# Altium footprint library PcbLib_Pin_Headers_part2.PcbLib: 68 footprints (part 1 of 5)
Each footprint in its own frame and in the unit in brackets; x right, y up, seen from the top. Pads: shape width x height; smd on the part's side, far side on the other; paste and mask are expansions set on the pad; w line width, h text height; cw(c..) or ccw(c..) is an arc to the next point about the centre after c.
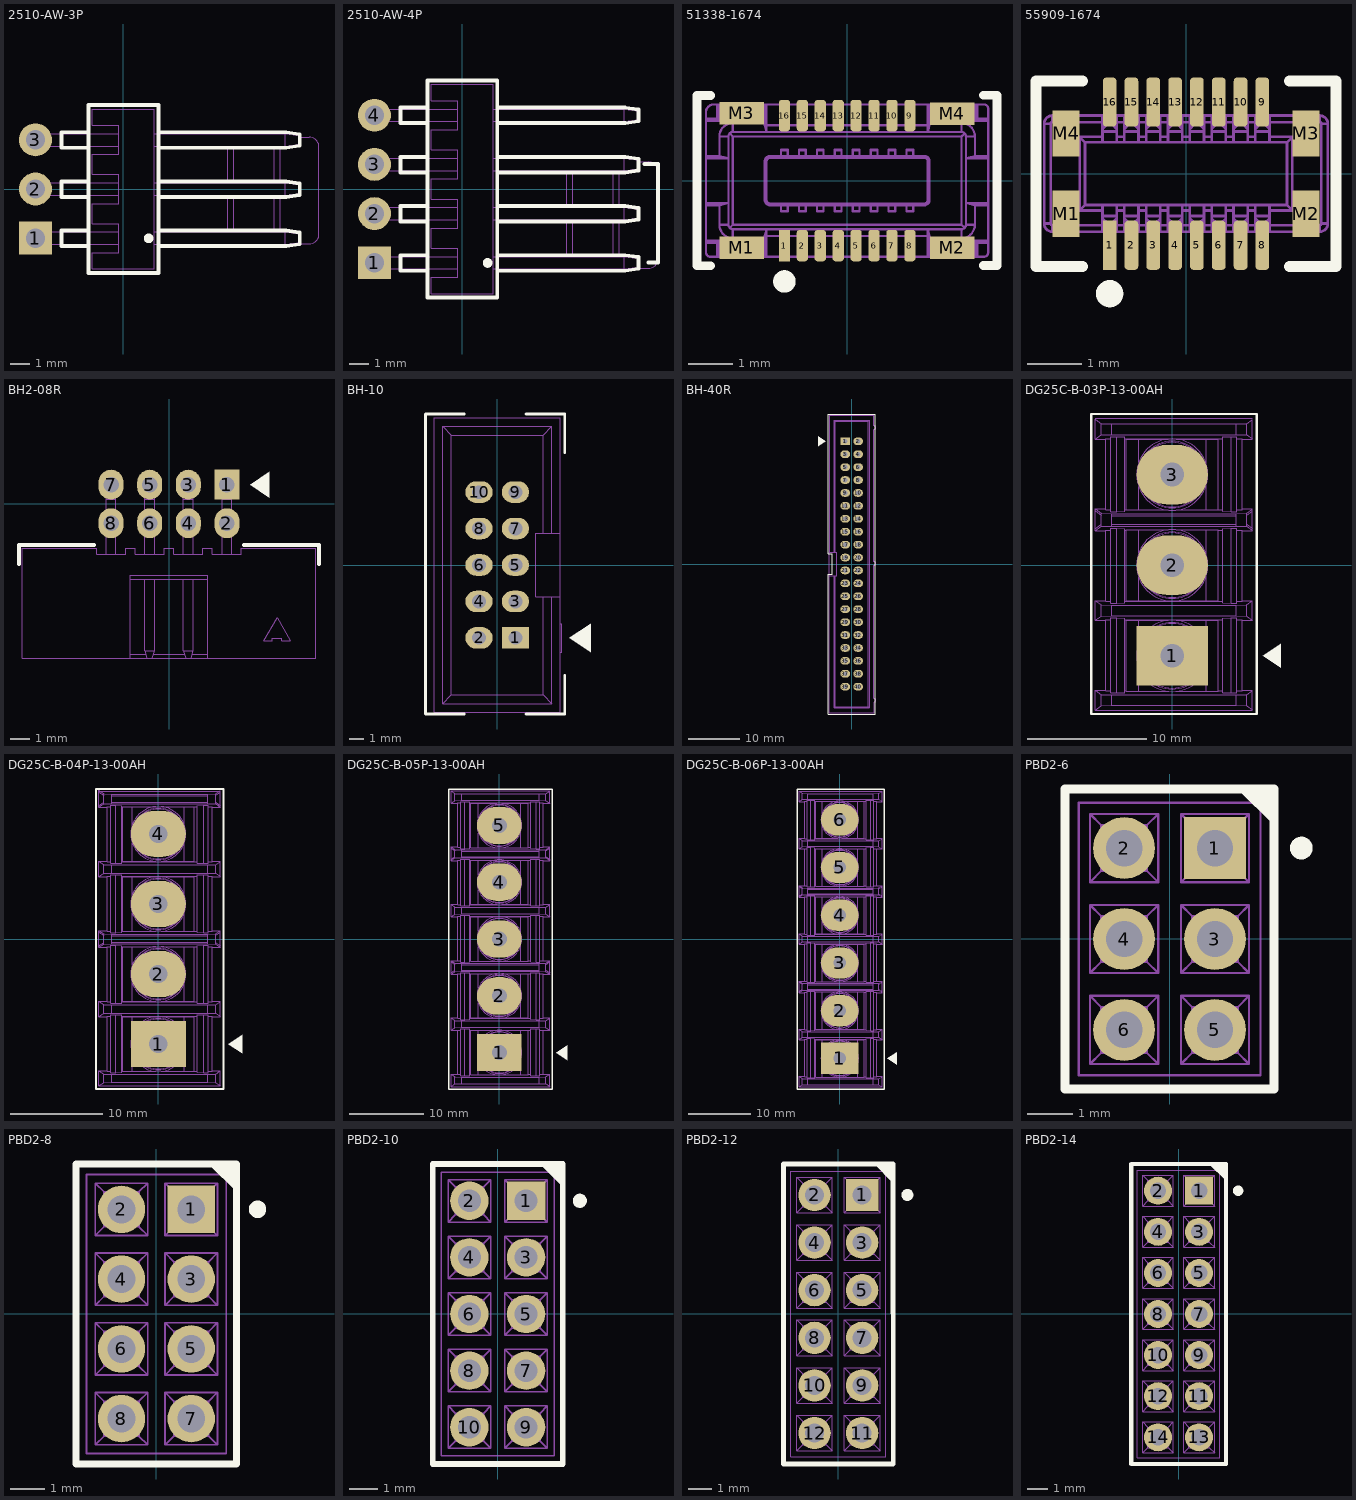
[diagram p0: the footprints below, top view; thin cyan lines are the x and y axes]

## 2510-AW-3P [mm]
pads (3):
  rect 1.7x1.7 hole 1: 1(-4.545,-2.54)
  round 1.7 hole 1: 2(-4.545,0) 3(-4.545,2.54)
Top Overlay:
  circle w0.25: c1.3,-2.55 r0.125
  lines w0.2: -1.8,-2.95 -3.2,-2.95 -3.2,-2.15 -1.8,-2.15 ; -1.8,-0.41 -3.2,-0.41 -3.2,0.39 -1.8,0.39 ; -1.8,2.13 -3.2,2.13 -3.2,2.93 -1.8,2.93 ; 1.8,-2.95 8.4,-2.95 9.1,-2.85 9.1,-2.25 8.4,-2.15 1.8,-2.15 ; 1.8,-0.41 8.4,-0.41 9.1,-0.31 9.1,0.29 8.4,0.39 1.8,0.39 ; 1.8,2.13 8.4,2.13 9.1,2.23 9.1,2.83 8.4,2.93 1.8,2.93 ; -1.8,-4.33 1.8,-4.33 1.8,4.33 -1.8,4.33 -1.8,-4.33
Top Assy:
  lines w0.05: -0.255,-2.86 -3.205,-2.86 ; -0.255,-2.22 -3.205,-2.22 ; -0.255,-0.32 -3.205,-0.32 ; -0.255,0.32 -3.205,0.32 ; -0.255,2.22 -3.205,2.22 ; -0.255,2.86 -3.205,2.86 ; 1.595,-2.86 8.345,-2.86 ; 1.595,-2.22 8.345,-2.22 ; 1.595,-0.32 8.345,-0.32 ; 1.595,0.32 8.345,0.32 ; 1.595,2.22 8.345,2.22 ; 1.595,2.86 8.345,2.86 ; 5.395,-2.22 5.395,-0.32 ; 5.395,0.32 5.395,2.22 ; 5.695,-2.22 5.695,-0.32 ; 5.695,0.32 5.695,2.22 ; 7.795,-2.22 7.795,-0.32 ; 7.795,0.32 7.795,2.22 ; 8.095,-2.22 8.095,-0.32 ; 8.095,0.32 8.095,2.22 ; 8.558,-2.83 9.595,-2.83 ccw(c9.595,-2.33) 10.095,-2.33 10.095,2.17 ccw(c9.595,2.17) 9.595,2.67 9.145,2.67 ; -3.205,-2.86 -3.205,-2.22 ; -3.205,-2.86 -4.845,-2.86 -4.845,-2.22 -3.205,-2.22 ; -3.205,-0.32 -3.205,0.32 ; -3.205,-0.32 -4.845,-0.32 -4.845,0.32 -3.205,0.32 ; -3.205,2.22 -3.205,2.86 ; -3.205,2.22 -4.845,2.22 -4.845,2.86 -3.205,2.86 ; 8.345,-2.86 8.345,-2.22 ; 8.345,-2.86 9.145,-2.748 9.145,-2.332 8.345,-2.22 ; 8.345,-0.32 8.345,0.32 ; 8.345,-0.32 9.145,-0.208 9.145,0.208 8.345,0.32 ; 8.345,2.22 8.345,2.86 ; 8.345,2.22 9.145,2.332 9.145,2.748 8.345,2.86 ; -1.605,-4.13 -1.605,-3.29 -0.255,-3.29 -0.255,-1.79 -1.605,-1.79 -1.605,-0.75 -0.255,-0.75 -0.255,0.75 -1.605,0.75 -1.605,1.79 -0.255,1.79 -0.255,3.29 -1.605,3.29 -1.605,4.13 1.595,4.13 1.595,-4.13 -1.605,-4.13
  text ".Designator" at 1.02,-3.098 h1.8
3D body "2510-AW-3p.x_t": height 5.75, standoff -3.35, extent -4.84,-4.13 10.1,4.13

## 2510-AW-4P [mm]
pads (4):
  rect 1.7x1.7 hole 1: 1(-4.545,-3.81)
  round 1.7 hole 1: 2(-4.545,-1.27) 3(-4.545,1.27) 4(-4.545,3.81)
Top Overlay:
  circle w0.25: c1.3,-3.82 r0.125
  lines w0.2: -1.8,-4.22 -3.2,-4.22 -3.2,-3.42 -1.8,-3.42 ; -1.8,-1.68 -3.2,-1.68 -3.2,-0.88 -1.8,-0.88 ; -1.8,0.86 -3.2,0.86 -3.2,1.66 -1.8,1.66 ; -1.8,3.4 -3.2,3.4 -3.2,4.2 -1.8,4.2 ; 1.8,-4.22 8.4,-4.22 9.1,-4.12 9.1,-3.52 8.4,-3.42 1.8,-3.42 ; 1.8,-1.68 8.4,-1.68 9.1,-1.58 9.1,-0.98 8.4,-0.88 1.8,-0.88 ; 1.8,0.86 8.4,0.86 9.1,0.96 9.1,1.56 8.4,1.66 1.8,1.66 ; 1.8,3.4 8.4,3.4 9.1,3.5 9.1,4.1 8.4,4.2 1.8,4.2 ; 9.4,1.3 10.1,1.3 10.1,-3.8 9.6,-3.8 ; -1.8,-5.6 -1.8,5.6 1.8,5.6 1.8,-5.6 -1.8,-5.6
Top Assy:
  lines w0.05: -0.255,-4.13 -3.205,-4.13 ; -0.255,-3.49 -3.205,-3.49 ; -0.255,-1.59 -3.205,-1.59 ; -0.255,-0.95 -3.205,-0.95 ; -0.255,0.95 -3.205,0.95 ; -0.255,1.59 -3.205,1.59 ; -0.255,3.49 -3.205,3.49 ; -0.255,4.13 -3.205,4.13 ; 1.595,-4.13 8.345,-4.13 ; 1.595,-3.49 8.345,-3.49 ; 1.595,-1.59 8.345,-1.59 ; 1.595,-0.95 8.345,-0.95 ; 1.595,0.95 8.345,0.95 ; 1.595,1.59 8.345,1.59 ; 1.595,3.49 8.345,3.49 ; 1.595,4.13 8.345,4.13 ; 5.395,-3.49 5.395,-1.59 ; 5.395,-0.95 5.395,0.95 ; 5.695,-3.49 5.695,-1.59 ; 5.695,-0.95 5.695,0.95 ; 7.795,-3.49 7.795,-1.59 ; 7.795,-0.95 7.795,0.95 ; 8.095,-3.49 8.095,-1.59 ; 8.095,-0.95 8.095,0.95 ; 8.558,-4.1 9.595,-4.1 ccw(c9.595,-3.6) 10.095,-3.6 10.095,0.9 ccw(c9.595,0.9) 9.595,1.4 9.145,1.4 ; -3.205,-4.13 -3.205,-3.49 ; -3.205,-4.13 -4.845,-4.13 -4.845,-3.49 -3.205,-3.49 ; -3.205,-1.59 -3.205,-0.95 ; -3.205,-1.59 -4.845,-1.59 -4.845,-0.95 -3.205,-0.95 ; -3.205,0.95 -3.205,1.59 ; -3.205,0.95 -4.845,0.95 -4.845,1.59 -3.205,1.59 ; -3.205,3.49 -3.205,4.13 ; -3.205,3.49 -4.845,3.49 -4.845,4.13 -3.205,4.13 ; 8.345,-4.13 8.345,-3.49 ; 8.345,-4.13 9.145,-4.018 9.145,-3.602 8.345,-3.49 ; 8.345,-1.59 8.345,-0.95 ; 8.345,-1.59 9.145,-1.478 9.145,-1.062 8.345,-0.95 ; 8.345,0.95 8.345,1.59 ; 8.345,0.95 9.145,1.062 9.145,1.478 8.345,1.59 ; 8.345,3.49 8.345,4.13 ; 8.345,3.49 9.145,3.602 9.145,4.018 8.345,4.13 ; -1.605,-5.4 1.595,-5.4 1.595,5.4 -1.605,5.4 -1.605,4.56 -0.255,4.56 -0.255,3.06 -1.605,3.06 -1.605,2.02 -0.255,2.02 -0.255,0.52 -1.605,0.52 -1.605,-0.52 -0.255,-0.52 -0.255,-2.02 -1.605,-2.02 -1.605,-3.06 -0.255,-3.06 -0.255,-4.56 -1.605,-4.56 -1.605,-5.4
  text ".Designator" at 1.02,-3.098 h1.8
3D body "2510-AW.x_t": height 5.75, standoff -3.35, extent -4.84,-5.4 10.1,5.4

## 51338-1674 [mm]
pads (20):
  rect 0.25x0.7 smd mask+0.05: 1(-1.4,-1.45)
  rrect50% 0.25x0.7 smd mask+0.05: 2(-1,-1.45) 3(-0.6,-1.45) 4(-0.2,-1.45) 5(0.2,-1.45) 6(0.6,-1.45) 7(1,-1.45) 8(1.4,-1.45) 9(1.4,1.45) 10(1,1.45) 11(0.6,1.45) 12(0.2,1.45) 13(-0.2,1.45) 14(-0.6,1.45) 15(-1,1.45) 16(-1.4,1.45)
  rect 1x0.5 smd mask+0.05: M1(-2.35,-1.5) M2(2.343,-1.496) M3(-2.35,1.5) M4(2.343,1.496)
Top Overlay:
  circle w0.25: c-1.4,-2.25 r0.125
  lines w0.2: -3.05,-1.9 -3.35,-1.9 -3.35,1.9 -3.05,1.9 ; 3.043,-1.896 3.343,-1.896 3.343,1.904 3.043,1.904
Top Assy:
  drawing of 359 lines, arcs and shapes, not listed
  text ".Designator" at -2.579,-0.349 h1.5
3D body "513381674.STEP": height 1.39, standoff -0.01, extent -3.15,-1.7 3.15,1.7

## 55909-1674 [mm]
pads (20):
  rect 0.25x0.9 smd mask+0.05: 1(-1.4,-1.312)
  rrect50% 0.25x0.9 smd mask+0.05: 2(-1,-1.312) 3(-0.6,-1.312) 4(-0.2,-1.312) 5(0.2,-1.312) 6(0.6,-1.312) 7(1,-1.312) 8(1.4,-1.312) 9(1.4,1.312) 10(1,1.312) 11(0.6,1.312) 12(0.2,1.312) 13(-0.2,1.312) 14(-0.6,1.312) 15(-1,1.312) 16(-1.4,1.312)
  rect 0.5x0.85 smd mask+0.05: M1(-2.2,-0.737) M2(2.2,-0.737) M3(2.2,0.737) M4(-2.2,0.737)
Top Overlay:
  circle w0.25: c-1.4,-2.2 r0.125
  lines w0.2: -1.9,-1.7 -2.75,-1.7 -2.75,1.7 -1.9,1.7 ; 1.9,-1.7 2.75,-1.7 2.75,1.7 1.9,1.7
Top Assy:
  drawing of 388 lines, arcs and shapes, not listed
  text ".Designator" at -2.064,-0.28 h1.2
3D body "559091674.STEP": height 1.19, standoff -0.01, extent -2.6,-1.565 2.6,1.565

## BH2-08R [mm]
pads (8):
  rect 1.3x1.55 hole 0.8: 1(3,1)
  oval 1.3x1.55 hole 0.8: 2(3,-1) 3(1,1) 4(1,-1) 5(-1,1) 6(-1,-1) 7(-3,1) 8(-3,-1)
Top Overlay:
  region: 4.2,1 5.2,1.667 5.2,0.333
  lines w0.2: -7.775,-3.125 -7.775,-2.125 -3.875,-2.125 ; 3.875,-2.125 7.775,-2.125 7.775,-3.125
Top Assy:
  lines w0.05: -3.25,-2.6 -3.25,0.25 ; -2.75,-2.6 -2.75,0.25 ; -2,-7.8 -1.196,-7.8 ; -2,-3.9 2,-3.9 ; -1.25,-3.9 -1.25,-7.6 ; -1.25,-2.6 -1.25,0.25 ; -0.804,-7.8 0.804,-7.8 ; -0.75,-3.9 -0.75,-7.6 ; -0.75,-2.6 -0.75,0.25 ; 0.75,-3.9 0.75,-7.6 ; 0.75,-2.6 0.75,0.25 ; 1.196,-7.8 2,-7.8 ; 1.25,-3.9 1.25,-7.6 ; 1.25,-2.6 1.25,0.25 ; 2.75,-2.6 2.75,0.25 ; 3.25,-2.6 3.25,0.25 ; -3.25,0.25 -2.75,0.25 ; -3.25,0.25 -3.25,1.25 -2.75,1.25 -2.75,0.25 ; -2,-8 -2,-3.7 2,-3.7 2,-8 ; -2,-8 -7.6,-8 -7.6,-2.3 -3.75,-2.3 -3.75,-2.6 -2.25,-2.6 -2.25,-2.3 -1.75,-2.3 -1.75,-2.6 -0.25,-2.6 -0.25,-2.3 0.25,-2.3 0.25,-2.6 1.75,-2.6 1.75,-2.3 2.25,-2.3 2.25,-2.6 3.75,-2.6 3.75,-2.3 7.6,-2.3 7.6,-8 2,-8 ; -2,-8 -1.143,-8 ; -1.25,-7.6 -0.75,-7.6 ; -1.25,-7.6 -1.143,-8 ; -1.25,0.25 -0.75,0.25 ; -1.25,0.25 -1.25,1.25 -0.75,1.25 -0.75,0.25 ; -1.143,-8 -0.857,-8 ; -0.857,-8 0.857,-8 ; -0.857,-8 -0.75,-7.6 ; 0.75,-7.6 1.25,-7.6 ; 0.75,-7.6 0.857,-8 ; 0.75,0.25 1.25,0.25 ; 0.75,0.25 0.75,1.25 1.25,1.25 1.25,0.25 ; 0.857,-8 1.143,-8 ; 1.143,-8 2,-8 ; 1.143,-8 1.25,-7.6 ; 2.75,0.25 3.25,0.25 ; 2.75,0.25 2.75,1.25 3.25,1.25 3.25,0.25 ; 4.907,-7.1 5.6,-5.9 6.293,-7.1 5.85,-7.1 5.85,-6.95 5.35,-6.95 5.35,-7.1 4.907,-7.1
  text ".Designator" at -7.943,-5.467 h2
3D body "BH2-08R.STEP": height 5.69, standoff -2.61, extent -7.6,-8 7.6,1.25

## BH-10 [mm] "DS1013-10S CONNFLY"
pads (10):
  rect 1.9x1.5 hole 0.95: 1(1.27,-5.08)
  oval 1.9x1.5 hole 0.95: 2(-1.27,-5.08) 3(1.27,-2.54) 4(-1.27,-2.54) 5(1.27,0) 6(-1.27,0) 7(1.27,2.54) 8(-1.27,2.54) 9(1.27,5.08) 10(-1.27,5.08)
Top Overlay:
  region: 5,-5.08 6.5,-4.08 6.5,-6.08
  lines w0.2: -2.3,-10.38 -5,-10.38 -5,-7.68 -5,0.92 -5,10.52 -2.3,10.52 ; 2,-10.38 4.7,-10.38 4.7,-7.68 ; 2,10.52 4.7,10.52 4.7,7.82
Top Assy:
  lines w0.05: 4.4,-6.08 4.5,-6.08 4.5,-4.08 4.4,-4.08 ; -3.8,-9.65 -3.8,9.65 ; -3.8,-9.65 3.8,-9.65 ; -3.8,-9.65 -3.2,-9.05 ; -3.8,9.65 3.8,9.65 ; -3.8,9.65 -3.2,9.05 ; -3.2,-9.05 -3.2,9.05 ; -3.2,-9.05 3.2,-9.05 ; -3.2,9.05 3.2,9.05 ; -1.59,-5.4 -1.49,-5.3 ; -1.59,-5.4 -1.59,-4.76 ; -1.59,-5.4 -0.95,-5.4 ; -1.59,-4.76 -1.49,-4.86 ; -1.59,-4.76 -0.95,-4.76 ; -1.59,-2.86 -1.49,-2.76 ; -1.59,-2.86 -1.59,-2.22 ; -1.59,-2.86 -0.95,-2.86 ; -1.59,-2.22 -1.49,-2.32 ; -1.59,-2.22 -0.95,-2.22 ; -1.59,-0.32 -0.95,-0.32 ; -1.59,-0.32 -1.49,-0.22 ; -1.59,-0.32 -1.59,0.32 ; -1.59,0.32 -1.49,0.22 ; -1.59,0.32 -0.95,0.32 ; -1.59,2.22 -0.95,2.22 ; -1.59,2.22 -1.49,2.32 ; -1.59,2.22 -1.59,2.86 ; -1.59,2.86 -1.49,2.76 ; -1.59,2.86 -0.95,2.86 ; -1.59,4.76 -1.49,4.86 ; -1.59,4.76 -1.59,5.4 ; -1.59,4.76 -0.95,4.76 ; -1.59,5.4 -1.49,5.3 ; -1.59,5.4 -0.95,5.4 ; -1.49,-5.3 -1.49,-4.86 ; -1.49,-5.3 -1.05,-5.3 ; -1.49,-4.86 -1.05,-4.86 ; -1.49,-2.76 -1.49,-2.32 ; -1.49,-2.76 -1.05,-2.76 ; -1.49,-2.32 -1.05,-2.32 ; -1.49,-0.22 -1.05,-0.22 ; -1.49,-0.22 -1.49,0.22 ; -1.49,0.22 -1.05,0.22 ; -1.49,2.32 -1.05,2.32 ; -1.49,2.32 -1.49,2.76 ; -1.49,2.76 -1.05,2.76 ; -1.49,4.86 -1.49,5.3 ; -1.49,4.86 -1.05,4.86 ; -1.49,5.3 -1.05,5.3 ; -1.05,-5.3 -1.05,-4.86 ; -1.05,-5.3 -0.95,-5.4 ; -1.05,-4.86 -0.95,-4.76 ; -1.05,-2.76 -1.05,-2.32 ; -1.05,-2.76 -0.95,-2.86 ; -1.05,-2.32 -0.95,-2.22 ; -1.05,-0.22 -0.95,-0.32 ; -1.05,-0.22 -1.05,0.22 ; -1.05,0.22 -0.95,0.32 ; -1.05,2.32 -0.95,2.22 ; -1.05,2.32 -1.05,2.76 ; -1.05,2.76 -0.95,2.86 ; -1.05,4.86 -1.05,5.3 ; -1.05,4.86 -0.95,4.76 ; -1.05,5.3 -0.95,5.4 ; -0.95,-5.4 -0.95,-4.76 ; -0.95,-2.86 -0.95,-2.22 ; -0.95,-0.32 -0.95,0.32 ; -0.95,2.22 -0.95,2.86 ; -0.95,4.76 -0.95,5.4 ; 0.95,-5.4 1.05,-5.3 ; 0.95,-5.4 0.95,-4.76 ; 0.95,-5.4 1.59,-5.4 ; 0.95,-4.76 1.05,-4.86 ; 0.95,-4.76 1.59,-4.76 ; 0.95,-2.86 1.05,-2.76 ; 0.95,-2.86 0.95,-2.22 ; 0.95,-2.86 1.59,-2.86 ; 0.95,-2.22 1.05,-2.32 ; 0.95,-2.22 1.59,-2.22 ; 0.95,-0.32 1.05,-0.22 ; 0.95,-0.32 0.95,0.32 ; 0.95,-0.32 1.59,-0.32 ; 0.95,0.32 1.05,0.22 ; 0.95,0.32 1.59,0.32 ; 0.95,2.22 1.05,2.32 ; 0.95,2.22 0.95,2.86 ; 0.95,2.22 1.59,2.22 ; 0.95,2.86 1.05,2.76 ; 0.95,2.86 1.59,2.86 ; 0.95,4.76 1.05,4.86 ; 0.95,4.76 0.95,5.4 ; 0.95,4.76 1.59,4.76 ; 0.95,5.4 1.05,5.3 ; 0.95,5.4 1.59,5.4 ; 1.05,-5.3 1.05,-4.86 ; 1.05,-5.3 1.49,-5.3 ; 1.05,-4.86 1.49,-4.86 ; 1.05,-2.76 1.05,-2.32 ; 1.05,-2.76 1.49,-2.76 ; 1.05,-2.32 1.49,-2.32 ; 1.05,-0.22 1.05,0.22 ; 1.05,-0.22 1.49,-0.22 ; 1.05,0.22 1.49,0.22 ; 1.05,2.32 1.05,2.76 ; 1.05,2.32 1.49,2.32 ; 1.05,2.76 1.49,2.76 ; 1.05,4.86 1.05,5.3 ; 1.05,4.86 1.49,4.86 ; 1.05,5.3 1.49,5.3 ; 1.49,-5.3 1.49,-4.86 ; 1.49,-5.3 1.59,-5.4 ; 1.49,-4.86 1.59,-4.76 ; 1.49,-2.76 1.49,-2.32 ; 1.49,-2.76 1.59,-2.86 ; 1.49,-2.32 1.59,-2.22 ; 1.49,-0.22 1.49,0.22 ; 1.49,-0.22 1.59,-0.32 ; 1.49,0.22 1.59,0.32 ; 1.49,2.32 1.59,2.22 ; 1.49,2.32 1.49,2.76 ; 1.49,2.76 1.59,2.86 ; 1.49,4.86 1.49,5.3 ; 1.49,4.86 1.59,4.76 ; 1.49,5.3 1.59,5.4 ; 1.59,-5.4 1.59,-4.76 ; 1.59,-2.86 1.59,-2.22 ; 1.59,-0.32 1.59,0.32 ; 1.59,2.22 1.59,2.86 ; 1.59,4.76 1.59,5.4 ; 3.2,-9.05 3.8,-9.65 ; 3.2,-9.05 3.2,-2.2 ; 3.2,-2.2 3.8,-2.2 ; 3.2,-2.2 2.7,-2.2 2.7,2.2 3.2,2.2 ; 3.2,2.2 3.2,9.05 ; 3.2,2.2 3.8,2.2 ; 3.2,9.05 3.8,9.65 ; 3.8,-9.65 3.8,-2.2 ; 3.8,-2.2 4.4,-2.2 ; 3.8,2.2 4.4,2.2 ; 3.8,2.2 3.8,9.65 ; 4.4,-2.2 4.4,-10.25 -4.4,-10.25 -4.4,10.25 4.4,10.25 4.4,2.2 ; 4.4,-2.2 4.4,2.2
  text ".Designator" at 5.967,-3.443 h2
3D body "User Library-IDC-10M.STEP": height 9.3, standoff -3.1, extent -4.7,-10.13 4.4,10.17

## BH-40R [mm]
pads (40):
  rect 1.9x1.5 hole 0.95: 1(-1.27,24.13)
  oval 1.9x1.5 hole 0.95: 2(1.27,24.13) 3(-1.27,21.59) 4(1.27,21.59) 5(-1.27,19.05) 6(1.27,19.05) 7(-1.27,16.51) 8(1.27,16.51) 9(-1.27,13.97) 10(1.27,13.97) 11(-1.27,11.43) 12(1.27,11.43) 13(-1.27,8.89) 14(1.27,8.89) 15(-1.27,6.35) 16(1.27,6.35) 17(-1.27,3.81) 18(1.27,3.81) 19(-1.27,1.27) 20(1.27,1.27) 21(-1.27,-1.27) 22(1.27,-1.27) 23(-1.27,-3.81) 24(1.27,-3.81) 25(-1.27,-6.35) 26(1.27,-6.35) 27(-1.27,-8.89) 28(1.27,-8.89) 29(-1.27,-11.43) 30(1.27,-11.43) 31(-1.27,-13.97) 32(1.27,-13.97) 33(-1.27,-16.51) 34(1.27,-16.51) 35(-1.27,-19.05) 36(1.27,-19.05) 37(-1.27,-21.59) 38(1.27,-21.59) 39(-1.27,-24.13) 40(1.27,-24.13)
Top Overlay:
  region: -5.08,24.13 -6.58,23.13 -6.58,25.13
  lines w0.2: -4.65,-29.5 4.65,-29.5 4.65,-2 4.65,29.5 -2.485,29.5 -4.65,29.5 -4.65,2 -3.875,2 -3.875,-2 -4.65,-2 -4.65,-29.5
Top Assy:
  drawing of 513 lines, arcs and shapes, not listed
  text ".Designator" at -5.967,3.443 h2
3D body "DS1013-40S (IDC-40MS CONNFLY).step": height 9.3, standoff -3.3, extent -4.475,-29.3 4.425,29.3

## DG25C-B-03P-13-00AH [mm]
pads (3):
  rect 6x5 hole 2: 1(0,-7.62)
  oval 6x5 hole 2: 2(0,0) 3(0,7.62)
Top Overlay:
  region: 7.62,-7.62 9.12,-6.62 9.12,-8.62
  lines w0.2: -6.8,-12.51 7.1,-12.51 7.1,12.71 -6.8,12.71 -6.8,-12.51
Top Assy:
  drawing of 414 lines, arcs and shapes, not listed
  text ".Designator" at 12.596,-8.606 h5
3D body "DG25C-B-03P.STEP": height 14.85, standoff -4.74, extent -6.484,-12.18 6.75,11.43

## DG25C-B-04P-13-00AH [mm]
pads (4):
  rect 6x5 hole 2: 1(0,-11.43)
  oval 6x5 hole 2: 2(0,-3.81) 3(0,3.81) 4(0,11.43)
Top Overlay:
  region: 7.62,-11.43 9.12,-10.43 9.12,-12.43
  lines w0.2: -6.8,-16.32 7.1,-16.32 7.1,16.32 -6.8,16.32 -6.8,-16.32
Top Assy:
  drawing of 551 lines, arcs and shapes, not listed
  text ".Designator" at 12.596,-8.606 h5
3D body "DG25C-B-04P.STEP": height 14.85, standoff -4.74, extent -6.484,-15.99 6.75,15.24

## DG25C-B-05P-13-00AH [mm]
pads (5):
  rect 6x5 hole 2: 1(0,-15.24)
  oval 6x5 hole 2: 2(0,-7.62) 3(0,0) 4(0,7.62) 5(0,15.24)
Top Overlay:
  region: 7.62,-15.24 9.12,-14.24 9.12,-16.24
  lines w0.2: -6.8,-20.13 -6.8,20.13 7.1,20.13 7.1,-20.13 -6.8,-20.13
Top Assy:
  drawing of 680 lines, arcs and shapes, not listed
  text ".Designator" at 12.596,-8.606 h5
3D body "DG25C-B-05P.STEP": height 14.85, standoff -4.74, extent -6.484,-19.8 6.75,19.05

## DG25C-B-06P-13-00AH [mm]
pads (6):
  rect 6x5 hole 2: 1(0,-19.05)
  oval 6x5 hole 2: 2(0,-11.43) 3(0,-3.81) 4(0,3.81) 5(0,11.43) 6(0,19.05)
Top Overlay:
  region: 7.62,-19.05 9.12,-18.05 9.12,-20.05
  lines w0.2: -6.8,-23.94 -6.8,23.96 7.1,23.96 7.1,-23.94 -6.8,-23.94
Top Assy:
  drawing of 810 lines, arcs and shapes, not listed
  text ".Designator" at 12.596,-8.606 h5
3D body "DG25C-B-06P.STEP": height 14.85, standoff -4.74, extent -6.484,-23.61 6.75,23.61

## PBD2-6 [mm]
pads (6):
  rect 1.36x1.36 hole 0.8: 1(1,2)
  round 1.36 hole 0.8: 2(-1,2) 3(1,0) 4(-1,0) 5(1,-2) 6(-1,-2)
Top Overlay:
  circle w0.25: c2.9,2 r0.125
  region: 2.3,2.5 1.5,3.3 2.3,3.3
  lines w0.2: -2.3,-3.3 2.3,-3.3 2.3,3.3 -2.3,3.3 -2.3,-3.3
Top Assy:
  drawing of 172 lines, arcs and shapes, not listed
  text ".Designator" at 3.92,-3.098 h1.8
3D body "PBD2-6.STEP": height 4.37, standoff -2.63, extent -2,-3 2,3

## PBD2-8 [mm]
pads (8):
  rect 1.36x1.36 hole 0.8: 1(1,3)
  round 1.36 hole 0.8: 2(-1,3) 3(1,1) 4(-1,1) 5(1,-1) 6(-1,-1) 7(1,-3) 8(-1,-3)
Top Overlay:
  circle w0.25: c2.9,3 r0.125
  region: 2.3,3.5 1.5,4.3 2.3,4.3
  lines w0.2: -2.3,-4.3 -2.3,4.3 2.3,4.3 2.3,-4.3 -2.3,-4.3
Top Assy:
  drawing of 228 lines, arcs and shapes, not listed
  text ".Designator" at 3.92,-3.098 h1.8
3D body "PBD2-8.STEP": height 4.37, standoff -2.63, extent -2,-4 2,4

## PBD2-10 [mm]
pads (10):
  rect 1.36x1.36 hole 0.8: 1(1,4)
  round 1.36 hole 0.8: 2(-1,4) 3(1,2) 4(-1,2) 5(1,0) 6(-1,0) 7(1,-2) 8(-1,-2) 9(1,-4) 10(-1,-4)
Top Overlay:
  circle w0.25: c2.9,4 r0.125
  region: 2.3,4.5 1.5,5.3 2.3,5.3
  lines w0.2: -2.3,-5.3 -2.3,5.3 2.3,5.3 2.3,-5.3 -2.3,-5.3
Top Assy:
  drawing of 284 lines, arcs and shapes, not listed
  text ".Designator" at 3.92,-3.098 h1.8
3D body "PBD2-10.STEP": height 4.37, standoff -2.63, extent -2,-5 2,5

## PBD2-12 [mm]
pads (12):
  rect 1.36x1.36 hole 0.8: 1(1,5)
  round 1.36 hole 0.8: 2(-1,5) 3(1,3) 4(-1,3) 5(1,1) 6(-1,1) 7(1,-1) 8(-1,-1) 9(1,-3) 10(-1,-3) 11(1,-5) 12(-1,-5)
Top Overlay:
  circle w0.25: c2.9,5 r0.125
  region: 2.3,5.5 1.5,6.3 2.3,6.3
  lines w0.2: -2.3,-6.3 -2.3,6.3 2.3,6.3 2.3,-6.3 -2.3,-6.3
Top Assy:
  drawing of 340 lines, arcs and shapes, not listed
  text ".Designator" at 3.92,-3.098 h1.8
3D body "PBD2-12.STEP": height 4.37, standoff -2.63, extent -2,-6 2,6

## PBD2-14 [mm]
pads (14):
  rect 1.36x1.36 hole 0.8: 1(1,6)
  round 1.36 hole 0.8: 2(-1,6) 3(1,4) 4(-1,4) 5(1,2) 6(-1,2) 7(1,0) 8(-1,0) 9(1,-2) 10(-1,-2) 11(1,-4) 12(-1,-4) 13(1,-6) 14(-1,-6)
Top Overlay:
  circle w0.25: c2.9,6 r0.125
  region: 2.3,6.5 1.5,7.3 2.3,7.3
  lines w0.2: -2.3,-7.3 -2.3,7.3 2.3,7.3 2.3,-7.3 -2.3,-7.3
Top Assy:
  drawing of 396 lines, arcs and shapes, not listed
  text ".Designator" at 3.92,-3.098 h1.8
3D body "PBD2-14.STEP": height 4.37, standoff -2.63, extent -2,-7 2,7